# Altium footprint library WaterSupplyController.PcbLib: 37 footprints (part 1 of 3)
Each footprint in its own frame and in the unit in brackets; x right, y up, seen from the top. Pads: shape width x height; smd on the part's side, far side on the other; paste and mask are expansions set on the pad; w line width, h text height; cw(c..) or ccw(c..) is an arc to the next point about the centre after c.
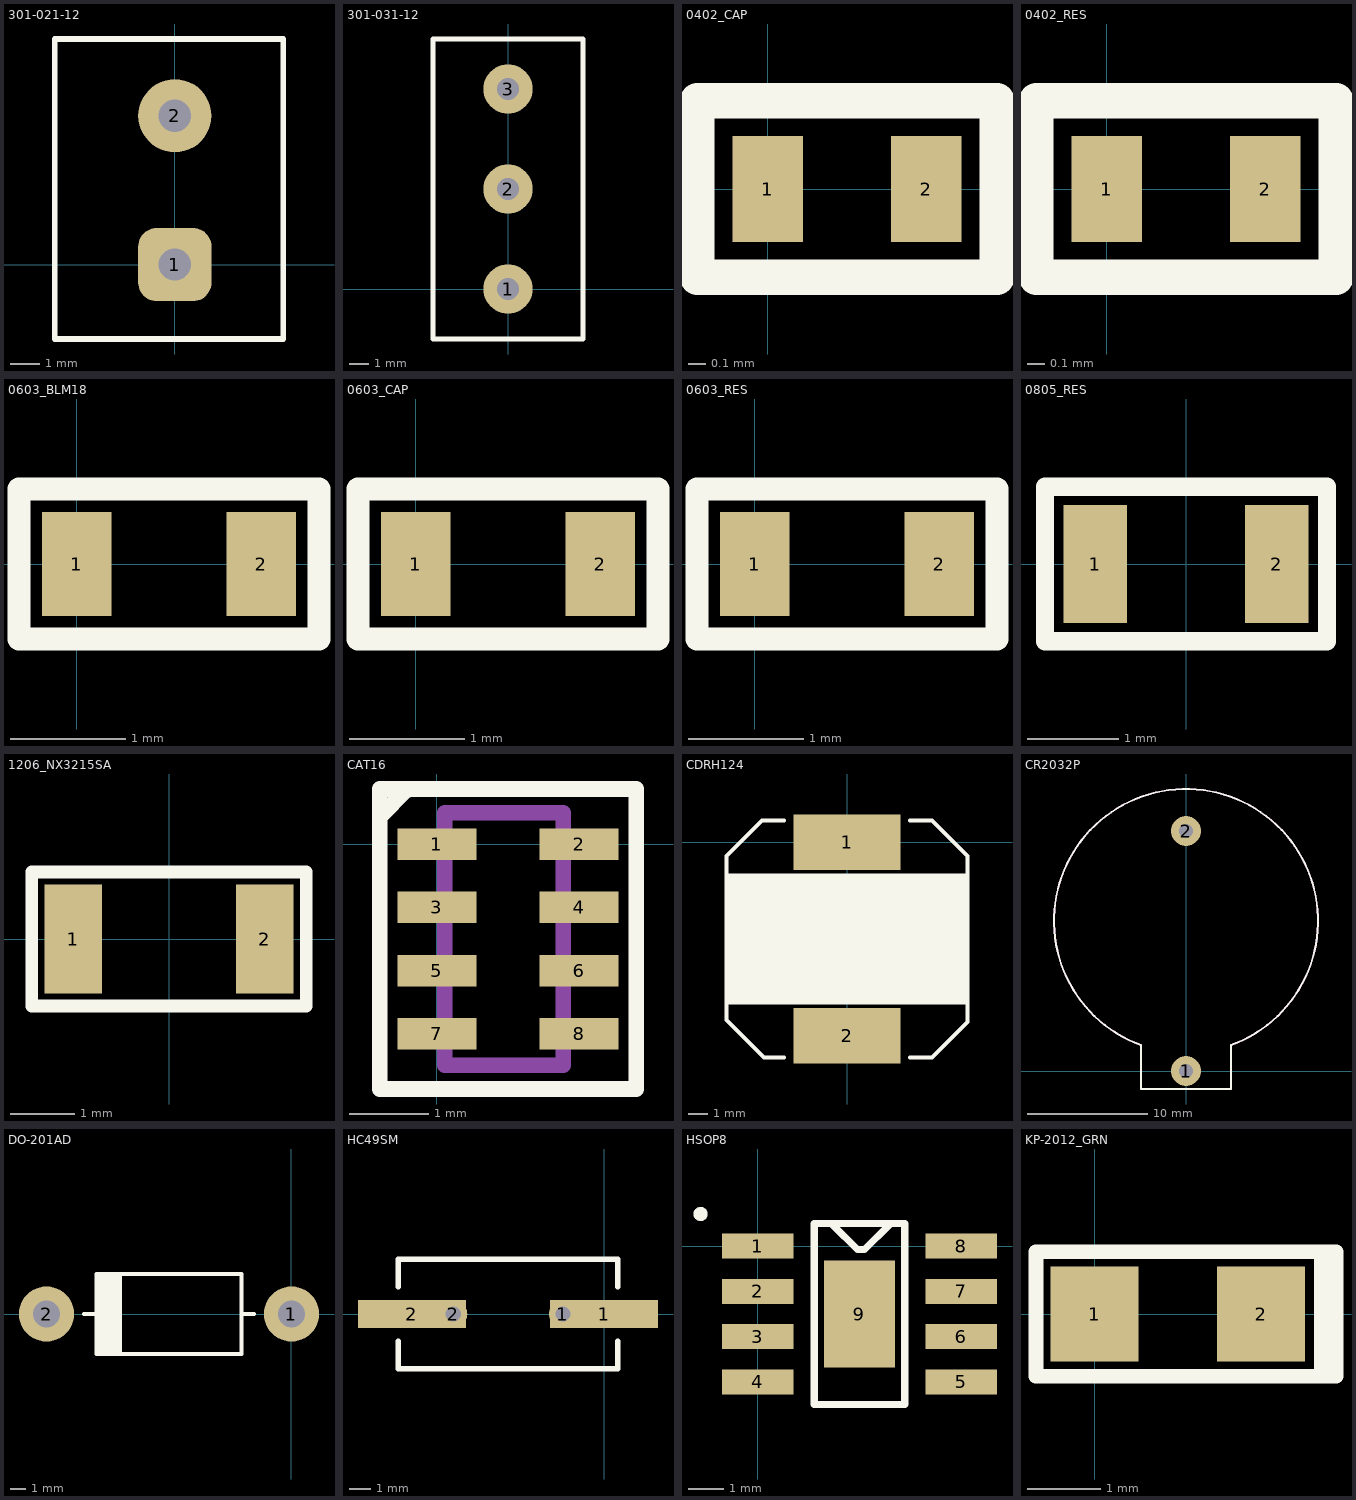
[diagram p0: the footprints below, top view; thin cyan lines are the x and y axes]

## 301-021-12 [mm] "XY301VA-5.0-2P-12, Клеммник винтовой, 2-контактный, 5мм, прямой"
height 10
pads (2):
  rrect50% 2.5x2.5 hole 1.1 mask+0.025: 1(0,0)
  round 2.5 hole 1.1 mask+0.025: 2(0,5.08)
Top Overlay:
  lines w0.2: -4.1,-2.54 -4.1,7.7 3.7,7.7 3.7,-2.54 -4.1,-2.54
3D body "User Library-xy301a_5.STEP": height 2.65, standoff -11.75, extent -4,-3.15 3.6,7.55

## 301-031-12 [mm] "XY301VA-5.0-3P-12, Клеммник винтовой, 3-контактный, 5мм, прямой"
height 10
pads (3):
  round 2.5 hole 1.1 mask+0.025: 1(0,0) 2(0,5.08) 3(0,10.16)
Top Overlay:
  lines w0.254: -3.81,-2.54 3.81,-2.54 3.81,12.7 -3.81,12.7 -3.81,-2.54
3D body "User Library-Terminal-Screw-3A-3way.SLDPRT": height 10, standoff -3, extent -3.81,-2.466 3.79,13.134

## 0402_CAP [mm] "Конденсатор 0402(1005)"
height 0.55
pads (2):
  rect 0.4x0.6 smd mask+0.025: 1(0,0) 2(0.9,0)
Top Overlay:
  lines w0.2: -0.4,-0.5 1.3,-0.5 1.3,0.5 -0.4,0.5 -0.4,-0.5
3D body "User Library-Capacitor 0402.SLDPRT": height 0.5, standoff 0, extent -0.05,-0.25 0.95,0.25

## 0402_RES [mm] "Резистор 0402(1005)"
height 0.35
pads (2):
  rect 0.4x0.6 smd mask+0.025: 1(0,0) 2(0.9,0)
Top Overlay:
  lines w0.2: -0.4,-0.5 1.3,-0.5 1.3,0.5 -0.4,0.5 -0.4,-0.5
3D body "User Library-RESC1005X04N.SLDPRT": height 0.35, standoff 0, extent -0.05,-0.25 0.95,0.25

## 0603_BLM18 [mm] "Ферритовый фильтр 0603(1608)"
height 0.8
pads (2):
  rect 0.6x0.9 smd mask+0.025: 1(0,0) 2(1.6,0)
Top Overlay:
  lines w0.2: -0.5,-0.65 2.1,-0.65 2.1,0.65 -0.5,0.65 -0.5,-0.65
3D body "User Library-BLM18K.SLDPRT": height 0.8, standoff 0, extent 0,-0.4 1.6,0.4

## 0603_CAP [mm] "Конденсатор 0603(1608)"
height 0.9
pads (2):
  rect 0.6x0.9 smd mask+0.025: 1(0,0) 2(1.6,0)
Top Overlay:
  lines w0.2: -0.5,-0.65 2.1,-0.65 2.1,0.65 -0.5,0.65 -0.5,-0.65
3D body "User Library-CAP_SMD-1 0603.SLDPRT": height 0.95, standoff 0.05, extent -0.05,-0.45 1.65,0.45

## 0603_RES [mm] "Резистор 0603(1608)"
height 0.45
pads (2):
  rect 0.6x0.9 smd mask+0.025: 1(0,0) 2(1.6,0)
Top Overlay:
  lines w0.2: -0.5,-0.65 2.1,-0.65 2.1,0.65 -0.5,0.65 -0.5,-0.65
3D body "User Library-RES_1609-0603.SLDPRT": height 0.56, standoff 0, extent -0.05,-0.4 1.65,0.4

## 0805_RES [mm] "Резистор 0805(2012)"
height 0.5
pads (2):
  rect 0.7x1.3 smd mask+0.025: 1(-1,0) 2(1,0)
Top Overlay:
  lines w0.2: -1.55,-0.85 -1.55,0.85 1.55,0.85 1.55,-0.85 -1.55,-0.85
3D body "User Library-RESC2012X05N.SLDPRT": height 0.45, standoff 0, extent -1,-0.625 1,0.625

## 1206_NX3215SA [mm] "Кварц. резонатор 1206(3216)"
height 0.8
pads (2):
  rect 0.9x1.7 smd mask+0.025: 1(-1.5,0) 2(1.5,0)
Top Overlay:
  lines w0.2: -2.15,-1.05 2.15,-1.05 2.15,1.05 -2.15,1.05 -2.15,-1.05
3D body "User Library-NDK_NX3215SA.SLDPRT": height 0.8, standoff 0, extent -1.6,-0.75 1.6,0.75

## CAT16 [mm]
pads (8):
  rect 1x0.4 smd mask+0.025: 1(0,0) 2(1.8,0) 3(0,-0.8) 4(1.8,-0.8) 5(0,-1.6) 6(1.8,-1.6) 7(0,-2.4) 8(1.8,-2.4)
Top Overlay:
  lines w0.2: -0.7,0.375 -0.4,0.675 ; -0.725,-3.1 2.525,-3.1 2.525,0.7 -0.725,0.7 -0.725,-3.1
Mechanical 2:
  lines w0.2: 0.1,-2.8 1.6,-2.8 1.6,0.4 0.1,0.4 0.1,-2.8
3D body "User Library-Array-1206-4Way-Var1.STEP": height 0.5, standoff 0, extent 0.1,-2.8 1.7,0.4

## CDRH124 [mm]
pads (2):
  rect 5.4x2.8 smd mask+0.025: 1(0,0) 2(0,-9.8)
Top Overlay:
  region: -6,-8.2 6,-8.2 6,-1.6 -6,-1.6
  lines w0.2: -3.2,-10.9 -4.2,-10.9 -6.1,-9 -6.1,-0.7 -4.3,1.1 -3.2,1.1 ; 3.2,-10.9 4.3,-10.9 6.1,-9.1 6.1,-0.7 4.3,1.1 3.2,1.1
3D body "User Library-CDRH124_Sumida (1).SLDPRT": height 4.5, standoff -0.05, extent -6.15,-11.05 6.15,1.25

## CR2032P [mm] "Top and Side Loading Coin Cell Holders"
pads (2):
  round 2.5 hole 1.2 mask+0.025: 1(0,0) 2(0,20)
Top Overlay:
  lines w0.15: -3.759,2.162 cw(c0,12.5) 3.759,2.162 ; -3.75,2.162 -3.75,-1.5 3.75,-1.5 3.75,2.162
Mechanical 29:
  lines w0.15: -3.759,1.162 -3.75,1.162 ; -3.759,2.162 cw(c0,12.5) 3.759,2.162 ; -3.759,2.165 -3.759,-1.5 3.741,-1.5 3.741,2.165 ; 3.75,1.162 3.759,1.162
  text ".Designator" at 1,11.6 h1
3D body "User Library-CR2032_HOR_HOLD.step": height 8.5, standoff -4, extent -11,-1 11,23.5

## DO-201AD [mm]
pads (2):
  round 3.5 hole 1.7: 1(0,0) 2(-15.557,0)
Top Overlay:
  region: -12.383,-2.54 -10.795,-2.54 -10.795,2.54 -12.383,2.54
  lines w0.254: -13.176,0 -12.414,0 ; -3.143,0 -2.381,0 ; -12.383,-2.54 -3.175,-2.54 -3.175,2.54 -12.383,2.54 -12.383,-2.54
3D body "User Library-DO-201AD.STEP": height 7.6, standoff -4, extent -16.027,-2.806 0.533,2.794

## HC49SM [mm]
pads (4):
  round 1.3 hole 0.7: 1(-1.9,0) 2(-6.98,0)
  rect 5x1.3 smd mask+0.025: 1(0,0) 2(-8.89,0)
Top Overlay:
  lines w0.254: -9.525,-1.27 -9.525,-2.54 0.635,-2.54 0.635,-1.27 ; -9.525,1.27 -9.525,2.54 0.635,2.54 0.635,1.27
3D body "User Library-Crystal HC49_US-SM.SLDPRT": height 4.3, standoff 0, extent -10.9,-2.415 1.9,2.415

## HSOP8 [mm]
pads (9):
  rect 2x0.7 smd mask+0.025: 1(0,0) 2(0,-1.27) 3(0,-2.54) 4(0,-3.81) 5(5.715,-3.81) 6(5.715,-2.54) 7(5.715,-1.27) 8(5.715,0)
  rect 2x3 smd mask+0.025: 9(2.857,-1.905)
Top Overlay:
  circle w0.2: c-1.6,0.9 r0.1
  lines w0.2: 2.1,0.6 2.8,-0.1 3,-0.1 3.7,0.6 ; 1.587,-4.445 4.127,-4.445 4.127,0.635 1.587,0.635 1.587,-4.445
3D body "User Library-HSOP-8-DDA.SLDPRT": height 1.7, standoff 0, extent -0.139,-4.246 5.889,0.446

## KP-2012_GRN [mm] "Светодиод 0805 Зелёный"
pads (2):
  rect 1.2x1.3 smd mask+0.025: 1(0,0) 2(2.275,0)
Top Overlay:
  lines w0.2: 3.1,-0.85 3.1,0.85 ; -0.8,-0.85 -0.8,0.85 3.3,0.85 3.3,-0.85 -0.8,-0.85
3D body "everlight-17-21-0805LED-GREEN.SLDPRT": height 1.1, standoff -0.01, extent 0.15,-0.625 2.15,0.625